# Altium footprint library MyLib.PcbLib: 575 footprints (part 25 of 36)
Each footprint in its own frame and in the unit in brackets; x right, y up, seen from the top. Pads: shape width x height; smd on the part's side, far side on the other; paste and mask are expansions set on the pad; w line width, h text height; cw(c..) or ccw(c..) is an arc to the next point about the centre after c.
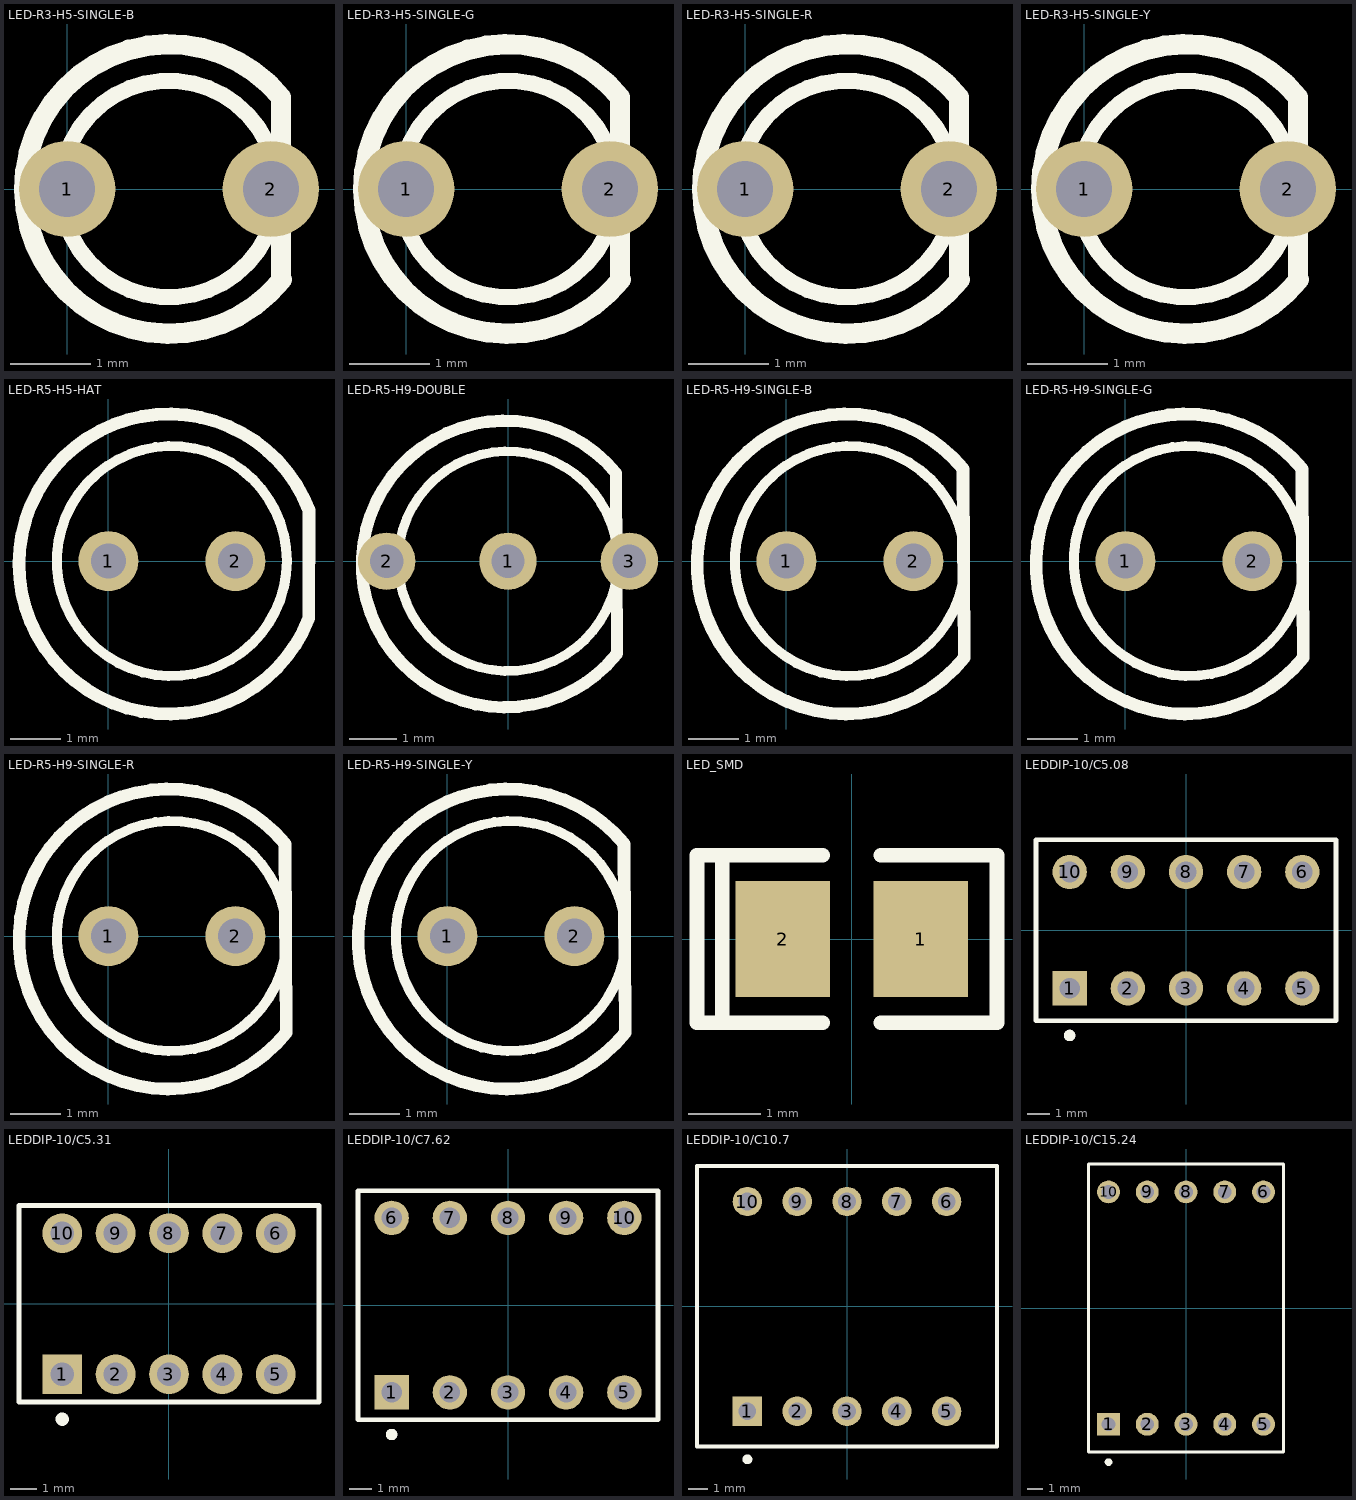
[diagram p24: the footprints below, top view; thin cyan lines are the x and y axes]

## LED-R3-H5-SINGLE-B [mm]
height 5
pads (2):
  round 1.2 hole 0.7: 1(0,0) 2(2.54,0)
Top Overlay:
  circle w0.2: c1.27,0 r1.35
  lines w0.254: 2.667,-1.115 2.667,1.143 ccw(c1.27,0) 2.679,-1.128
3D body: height 5.2, standoff -2, extent -0.73,-1.998 2.79,1.998

## LED-R3-H5-SINGLE-G [mm]
height 5
pads (2):
  round 1.2 hole 0.7: 1(0,0) 2(2.54,0)
Top Overlay:
  circle w0.2: c1.27,0 r1.35
  lines w0.254: 2.667,-1.115 2.667,1.143 ccw(c1.27,0) 2.679,-1.128
3D body: height 5.2, standoff -2, extent -0.73,-1.998 2.79,1.998

## LED-R3-H5-SINGLE-R [mm]
height 5
pads (2):
  round 1.2 hole 0.7: 1(0,0) 2(2.54,0)
Top Overlay:
  circle w0.2: c1.27,0 r1.35
  lines w0.254: 2.667,-1.115 2.667,1.143 ccw(c1.27,0) 2.679,-1.128
3D body: height 5.2, standoff -2, extent -0.73,-1.998 2.79,1.998

## LED-R3-H5-SINGLE-Y [mm]
height 5
pads (2):
  round 1.2 hole 0.7: 1(0,0) 2(2.54,0)
Top Overlay:
  circle w0.2: c1.27,0 r1.35
  lines w0.254: 2.667,-1.115 2.667,1.143 ccw(c1.27,0) 2.679,-1.128
3D body: height 5.2, standoff -2, extent -0.73,-1.998 2.79,1.998

## LED-R5-H5-HAT [mm]
height 5
pads (2):
  round 1.2 hole 0.7: 1(0,0) 2(2.54,0)
Top Overlay:
  circle w0.2: c1.27,0 r2.3
  lines w0.254: 4.01,-1.143 cw(c1.212,-0.059) 4.013,1.016 4.01,-1.143
3D body: height 5, standoff 1.5, extent -1.029,-2.299 3.569,2.299
3D body: height 1.5, standoff 0.5, extent -1.789,-3.062 4.014,2.944

## LED-R5-H9-DOUBLE [mm]
height 9
pads (3):
  round 1.2 hole 0.7: 1(0,0) 2(-2.54,0) 3(2.54,0)
Top Overlay:
  circle w0.2: c0,0 r2.3
  lines w0.254: 2.264,1.841 ccw(c-0.058,-0.059) 2.285,-1.933 2.264,1.841
3D body: height 8.5, standoff -1.5, extent -2.866,-2.863 2.769,2.864

## LED-R5-H9-SINGLE-B [mm]
height 9
pads (2):
  round 1.2 hole 0.7: 1(0,0) 2(2.54,0)
Top Overlay:
  circle w0.2: c1.27,0 r2.3
  lines w0.254: 3.534,1.841 ccw(c1.212,-0.059) 3.555,-1.933 3.534,1.841
3D body "LED5_BLUE.STEP": height 1.5, standoff -9.1, extent -1.707,-2.85 3.643,2.85

## LED-R5-H9-SINGLE-G [mm]
height 9
pads (2):
  round 1.2 hole 0.7: 1(0,0) 2(2.54,0)
Top Overlay:
  circle w0.2: c1.27,0 r2.3
  lines w0.254: 3.534,1.841 ccw(c1.212,-0.059) 3.555,-1.933 3.534,1.841
3D body "LED5_GRE.STEP": height 1.5, standoff -9.1, extent -1.357,-2.977 3.993,2.723

## LED-R5-H9-SINGLE-R [mm]
height 9
pads (2):
  round 1.2 hole 0.7: 1(0,0) 2(2.54,0)
Top Overlay:
  circle w0.2: c1.27,0 r2.3
  lines w0.254: 3.534,1.841 ccw(c1.212,-0.059) 3.555,-1.933 3.534,1.841
3D body "LED5_RED.STEP": height 1.5, standoff -9.1, extent -1.357,-2.85 3.993,2.85

## LED-R5-H9-SINGLE-Y [mm]
height 9
pads (2):
  round 1.2 hole 0.7: 1(0,0) 2(2.54,0)
Top Overlay:
  circle w0.2: c1.27,0 r2.3
  lines w0.254: 3.534,1.841 ccw(c1.212,-0.059) 3.555,-1.933 3.534,1.841
3D body "LED5_YEL.STEP": height 1.5, standoff -9.1, extent -1.357,-2.85 3.993,2.85

## LED_SMD [mm]
height 2
pads (2):
  rect 1.3x1.6 smd: 1(0.95,0) 2(-0.95,0)
Top Overlay:
  lines w0.2: -1.78,-1.15 -1.78,1.15 ; -0.4,-1.15 -2.13,-1.15 -2.13,1.15 -0.4,1.15 ; 0.4,-1.15 2,-1.15 2,1.15 0.4,1.15

## LEDDIP-10/C5.08 [mm]
pads (10):
  rect 1.5x1.5 hole 0.9: 1(-5.08,-2.54)
  round 1.5 hole 0.9: 2(-2.54,-2.54) 3(0,-2.54) 4(2.54,-2.54) 5(5.08,-2.54) 6(5.08,2.54) 7(2.54,2.54) 8(0,2.54) 9(-2.54,2.54) 10(-5.08,2.54)
Top Overlay:
  circle w0.25: c-5.08,-4.6 r0.125
  lines w0.2: -6.55,-3.95 6.55,-3.95 6.55,3.95 -6.55,3.95 -6.55,-3.95

## LEDDIP-10/C5.31 [mm]
pads (10):
  rect 1.5x1.5 hole 0.9: 1(-4.02,-2.655)
  round 1.5 hole 0.9: 2(-2.01,-2.655) 3(0,-2.655) 4(2.01,-2.655) 5(4.02,-2.655) 6(4.02,2.655) 7(2.01,2.655) 8(0,2.655) 9(-2.01,2.655) 10(-4.02,2.655)
Top Overlay:
  circle w0.25: c-4.02,-4.35 r0.125
  lines w0.2: -5.65,-3.7 5.65,-3.7 5.65,3.7 -5.65,3.7 -5.65,-3.7

## LEDDIP-10/C7.62 [mm]
pads (10):
  rect 1.5x1.5 hole 0.9: 1(-5.08,-3.81)
  round 1.5 hole 0.9: 2(-2.54,-3.81) 3(0,-3.81) 4(2.54,-3.81) 5(5.08,-3.81) 6(-5.08,3.81) 7(-2.54,3.81) 8(0,3.81) 9(2.54,3.81) 10(5.08,3.81)
Top Overlay:
  circle w0.25: c-5.08,-5.65 r0.125
  lines w0.2: -6.55,-5 6.55,-5 6.55,5 -6.55,5 -6.55,-5

## LEDDIP-10/C10.7 [mm]
pads (10):
  rect 1.5x1.5 hole 0.9: 1(-5.08,-5.35)
  round 1.5 hole 0.9: 2(-2.54,-5.35) 3(0,-5.35) 4(2.54,-5.35) 5(5.08,-5.35) 6(5.08,5.35) 7(2.54,5.35) 8(0,5.35) 9(-2.54,5.35) 10(-5.08,5.35)
Top Overlay:
  circle w0.25: c-5.08,-7.8 r0.125
  lines w0.2: -7.65,-7.15 -7.65,-0.635 -7.65,7.15 7.65,7.15 7.65,-7.15 -7.65,-7.15

## LEDDIP-10/C15.24 [mm]
pads (10):
  rect 1.5x1.5 hole 0.9: 1(-5.08,-7.62)
  round 1.5 hole 0.9: 2(-2.54,-7.62) 3(0,-7.62) 4(2.54,-7.62) 5(5.08,-7.62) 6(5.08,7.62) 7(2.54,7.62) 8(0,7.62) 9(-2.54,7.62) 10(-5.08,7.62)
Top Overlay:
  circle w0.25: c-5.08,-10.1 r0.125
  lines w0.2: -6.4,-9.45 -6.4,9.45 6.4,9.45 6.4,-9.45 -6.4,-9.45